# Altium footprint library Cty1.PcbLib: 1378 footprints (part 73 of 87)
Each footprint in its own frame and in the unit in brackets; x right, y up, seen from the top. Pads: shape width x height; smd on the part's side, far side on the other; paste and mask are expansions set on the pad; w line width, h text height; cw(c..) or ccw(c..) is an arc to the next point about the centre after c.
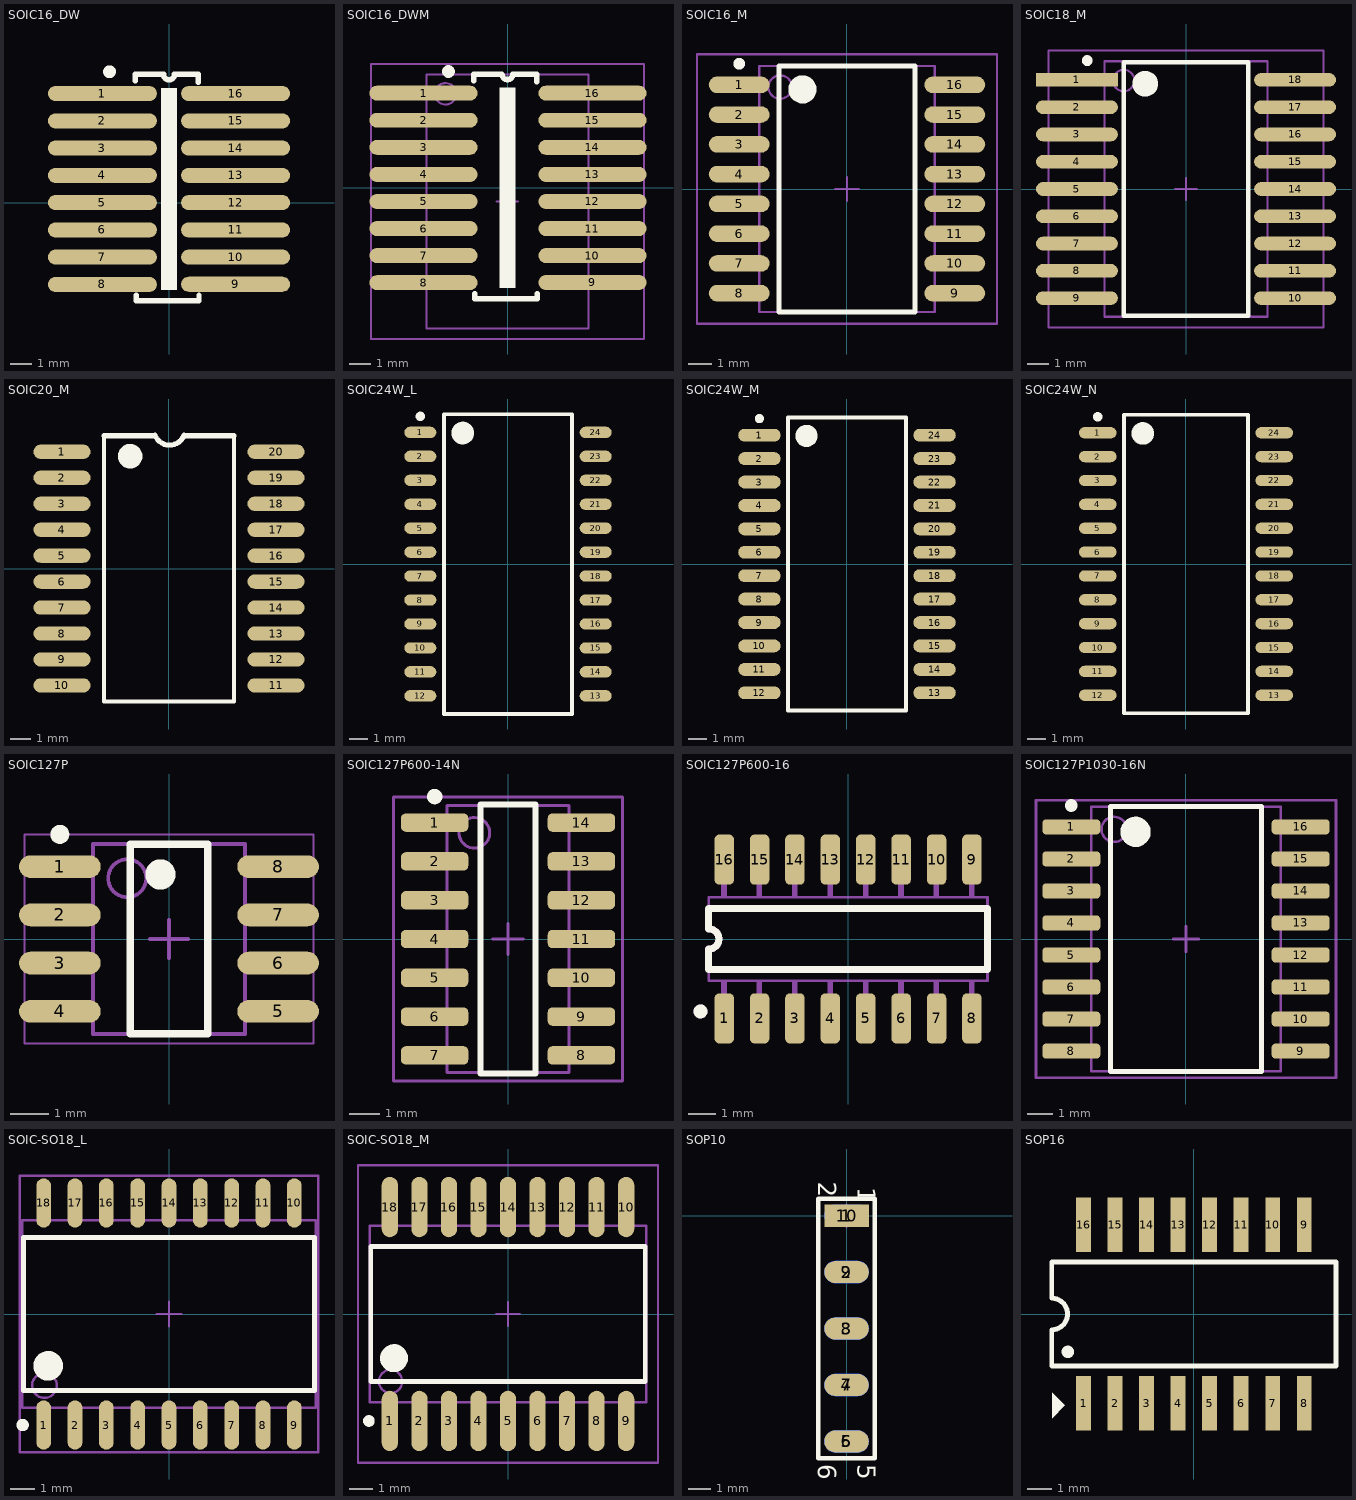
[diagram p72: the footprints below, top view; thin cyan lines are the x and y axes]

## SOIC16_DW [mm] "SOIC, 16-Leads, Body 10x3.8mm, Pitch 1.27mm"
height 2.65
pads (16):
  oval 5.08x0.7 smd: 1(-3.1,5.08) 2(-3.1,3.81) 3(-3.1,2.54) 4(-3.1,1.27) 5(-3.1,0) 6(-3.1,-1.27) 7(-3.1,-2.54) 8(-3.1,-3.81) 9(3.1,-3.8) 10(3.1,-2.54) 11(3.1,-1.27) 12(3.1,0) 13(3.1,1.27) 14(3.1,2.54) 15(3.1,3.81) 16(3.1,5.08)
Top Overlay:
  circle w0.4: c-2.767,6.096 r0.1
  rectangle: -0.381,-4.064 0.381,5.334
  lines w0.254: -1.575,5.664 -1.575,5.969 -0.254,5.969 ccw(c0,5.969) 0.254,5.969 1.372,5.969 1.372,5.613 ; -1.524,-4.318 -1.524,-4.572 1.397,-4.572 1.397,-4.318

## SOIC16_DWM [mm] "SOIC, 16-Leads, Body 10x3.8mm, Pitch 0.3inc"
height 2.65
pads (16):
  oval 5.08x0.7 smd: 1(-3.963,4.445) 2(-3.963,3.175) 3(-3.963,1.905) 4(-3.963,0.635) 5(-3.963,-0.635) 6(-3.963,-1.905) 7(-3.963,-3.175) 8(-3.963,-4.445) 9(3.963,-4.435) 10(3.963,-3.175) 11(3.963,-1.905) 12(3.963,-0.635) 13(3.963,0.635) 14(3.963,1.905) 15(3.963,3.175) 16(3.963,4.445)
Top Overlay:
  circle w0.4: c-2.793,5.461 r0.1
  rectangle: -0.407,-4.699 0.355,4.699
  lines w0.254: -1.601,5.029 -1.601,5.334 -0.28,5.334 ccw(c-0.026,5.334) 0.228,5.334 1.346,5.334 1.346,4.978 ; -1.55,-4.953 -1.55,-5.207 1.371,-5.207 1.371,-4.953
Mechanical 13:
  circle w0.1: c-2.926,4.415 r0.5
  lines w0.1: -3.826,-6.585 -3.826,5.315 3.774,5.315 3.774,-6.585 -3.826,-6.585
Mechanical 15:
  lines w0.1: -0.526,-0.635 0.474,-0.635 ; -0.026,-1.135 -0.026,-0.135 ; -6.426,-7.085 -6.426,5.815 6.374,5.815 6.374,-7.085 -6.426,-7.085
3D body: height 2.65, standoff 0, extent -3.826,-6.585 3.774,5.315

## SOIC16_M [mm] "16-Pin Small Outline Integrated Circuit Package (SOIC16), IPC Low Density"
height 2.65
pads (16):
  oval 2.6x0.7 smd: 1(-4.6,4.445) 2(-4.6,3.175) 3(-4.6,1.905) 4(-4.6,0.635) 5(-4.6,-0.635) 6(-4.6,-1.905) 7(-4.6,-3.175) 8(-4.6,-4.445) 9(4.6,-4.445) 10(4.6,-3.175) 11(4.6,-1.905) 12(4.6,-0.635) 13(4.6,0.635) 14(4.6,1.905) 15(4.6,3.175) 16(4.6,4.445)
Top Overlay:
  circle w0.6: c-1.9,4.25 r0.3
  circle w0.25: c-4.6,5.345 r0.125
  lines w0.2: -2.9,-5.25 2.9,-5.25 2.9,5.25 -2.9,5.25 -2.9,-5.25
Mechanical 13:
  circle w0.1: c-2.85,4.35 r0.5
  lines w0.1: -3.75,-5.25 3.75,-5.25 3.75,5.25 -3.75,5.25 -3.75,-5.25
Mechanical 15:
  lines w0.1: -0.5,0 0.5,0 ; 0,-0.5 0,0.5 ; -6.4,-5.75 6.4,-5.75 6.4,5.75 -6.4,5.75 -6.4,-5.75
3D body: height 2.65, standoff 0, extent -3.75,-5.25 3.75,5.25

## SOIC18_M [mm] "SOIC, 18-Leads, Body 11.6x7.5mm, Pitch 1.27mm, IPC Low Density"
height 2.65
pads (18):
  rect 3.81x0.635 smd: 1(-5.08,5.08)
  oval 3.81x0.635 smd: 2(-5.08,3.81) 3(-5.08,2.54) 4(-5.08,1.27) 5(-5.08,0) 6(-5.08,-1.27) 7(-5.08,-2.54) 8(-5.08,-3.81) 9(-5.08,-5.08) 10(5.08,-5.08) 11(5.08,-3.81) 12(5.08,-2.54) 13(5.08,-1.27) 14(5.08,0) 15(5.08,1.27) 16(5.08,2.54) 17(5.08,3.81) 18(5.08,5.08)
Top Overlay:
  circle w0.25: c-4.6,5.98 r0.125
  circle w0.6: c-1.9,4.9 r0.3
  lines w0.2: -2.9,-5.9 -2.9,5.9 2.9,5.9 2.9,-5.9 -2.9,-5.9
Mechanical 13:
  circle w0.1: c-2.9,5.05 r0.5
  lines w0.1: -3.8,-5.95 -3.8,5.95 3.8,5.95 3.8,-5.95 -3.8,-5.95
Mechanical 15:
  lines w0.1: -0.5,0 0.5,0 ; 0,-0.5 0,0.5 ; -6.4,-6.45 -6.4,6.45 6.4,6.45 6.4,-6.45 -6.4,-6.45

## SOIC20_M [mm] "20-Pin Small Outline Integrated Circuit 1.27 mm Pitch, IPC Low Density"
height 2.65
pads (20):
  oval 2.794x0.7 smd: 1(-5.235,5.715) 2(-5.235,4.445) 3(-5.235,3.175) 4(-5.235,1.905) 5(-5.235,0.635) 6(-5.235,-0.635) 7(-5.235,-1.905) 8(-5.235,-3.175) 9(-5.235,-4.445) 10(-5.235,-5.715) 11(5.235,-5.715) 12(5.235,-4.445) 13(5.235,-3.175) 14(5.235,-1.905) 15(5.235,-0.635) 16(5.235,0.635) 17(5.235,1.905) 18(5.235,3.175) 19(5.235,4.445) 20(5.235,5.715)
Top Overlay:
  circle w0.6: c-1.9,5.5 r0.3
  lines w0.2: -3.175,6.5 -3.175,-6.5 3.175,-6.5 3.175,6.5
  lines w0.254: -3.175,6.5 -0.785,6.5 ; -0.692,6.535 ccw(c0.022,6.802) 0.73,6.522 ; 0.785,6.5 3.175,6.5

## SOIC24W_L [mm] "SOIC, 24-Leads, Body 15.4x7.5mm, Pitch 1.27mm, IPC High Density"
height 2.67
pads (24):
  oval 1.7x0.6 smd: 1(-4.65,6.985) 2(-4.65,5.715) 3(-4.65,4.445) 4(-4.65,3.175) 5(-4.65,1.905) 6(-4.65,0.635) 7(-4.65,-0.635) 8(-4.65,-1.905) 9(-4.65,-3.175) 10(-4.65,-4.445) 11(-4.65,-5.715) 12(-4.65,-6.985) 13(4.65,-6.985) 14(4.65,-5.715) 15(4.65,-4.445) 16(4.65,-3.175) 17(4.65,-1.905) 18(4.65,-0.635) 19(4.65,0.635) 20(4.65,1.905) 21(4.65,3.175) 22(4.65,4.445) 23(4.65,5.715) 24(4.65,6.985)
Top Overlay:
  circle w0.25: c-4.65,7.835 r0.125
  circle w0.6: c-2.4,6.95 r0.3
  lines w0.2: -3.4,-7.95 -3.4,7.95 3.4,7.95 3.4,-7.95 -3.4,-7.95

## SOIC24W_M [mm] "SOIC, 24-Leads, Body 15.4x7.5mm, Pitch 1.27mm, IPC Low Density"
height 2.67
pads (24):
  oval 2.3x0.7 smd: 1(-4.75,6.985) 2(-4.75,5.715) 3(-4.75,4.445) 4(-4.75,3.175) 5(-4.75,1.905) 6(-4.75,0.635) 7(-4.75,-0.635) 8(-4.75,-1.905) 9(-4.75,-3.175) 10(-4.75,-4.445) 11(-4.75,-5.715) 12(-4.75,-6.985) 13(4.75,-6.985) 14(4.75,-5.715) 15(4.75,-4.445) 16(4.75,-3.175) 17(4.75,-1.905) 18(4.75,-0.635) 19(4.75,0.635) 20(4.75,1.905) 21(4.75,3.175) 22(4.75,4.445) 23(4.75,5.715) 24(4.75,6.985)
Top Overlay:
  circle w0.6: c-2.2,6.95 r0.3
  circle w0.25: c-4.75,7.885 r0.125
  lines w0.2: -3.2,-7.95 3.2,-7.95 3.2,7.95 -3.2,7.95 -3.2,-7.95

## SOIC24W_N [mm] "SOIC, 24-Leads, Body 15.4x7.5mm, Pitch 1.27mm, IPC Medium Density"
height 2.67
pads (24):
  oval 2x0.6 smd: 1(-4.7,6.985) 2(-4.7,5.715) 3(-4.7,4.445) 4(-4.7,3.175) 5(-4.7,1.905) 6(-4.7,0.635) 7(-4.7,-0.635) 8(-4.7,-1.905) 9(-4.7,-3.175) 10(-4.7,-4.445) 11(-4.7,-5.715) 12(-4.7,-6.985) 13(4.7,-6.985) 14(4.7,-5.715) 15(4.7,-4.445) 16(4.7,-3.175) 17(4.7,-1.905) 18(4.7,-0.635) 19(4.7,0.635) 20(4.7,1.905) 21(4.7,3.175) 22(4.7,4.445) 23(4.7,5.715) 24(4.7,6.985)
Top Overlay:
  circle w0.25: c-4.7,7.835 r0.125
  circle w0.6: c-2.3,6.95 r0.3
  lines w0.2: -3.3,-7.95 -3.3,7.95 3.3,7.95 3.3,-7.95 -3.3,-7.95

## SOIC127P [mm] "SOIC, 8-Leads, Body 5.00x4.00mm, Pitch 1.27mm, IPC Medium Density"
height 1.7
pads (8):
  oval 2.15x0.6 smd: 1(-2.875,1.905) 2(-2.875,0.635) 3(-2.875,-0.635) 4(-2.875,-1.905) 5(2.875,-1.905) 6(2.875,-0.635) 7(2.875,0.635) 8(2.875,1.905)
Top Overlay:
  circle w0.4: c-0.225,1.7 r0.2
  circle w0.25: c-2.875,2.755 r0.125
  lines w0.2: -1.025,-2.5 1.025,-2.5 1.025,2.5 -1.025,2.5 -1.025,-2.5
Mechanical 13:
  circle w0.1: c-1.1,1.6 r0.5
  lines w0.1: -2,-2.5 2,-2.5 2,2.5 -2,2.5 -2,-2.5
Mechanical 15:
  lines w0.05: -3.8,-2.75 3.8,-2.75 3.8,2.75 -3.8,2.75 -3.8,-2.75
  lines w0.1: -0.5,0 0.5,0 ; 0,-0.5 0,0.5
3D body: height 1.7, standoff 1.7, extent -2,-2.5 2,2.5

## SOIC127P600-14N [mm]
pads (14):
  rrect50% 2.2x0.6 smd: 1(-2.4,3.81) 2(-2.4,2.54) 3(-2.4,1.27) 4(-2.4,0) 5(-2.4,-1.27) 6(-2.4,-2.54) 7(-2.4,-3.81) 8(2.4,-3.81) 9(2.4,-2.54) 10(2.4,-1.27) 11(2.4,0) 12(2.4,1.27) 13(2.4,2.54) 14(2.4,3.81)
Top Overlay:
  circle w0.25: c-2.4,4.66 r0.125
  lines w0.2: -0.9,-4.4 -0.9,4.4 0.9,4.4 0.9,-4.4 -0.9,-4.4
Mechanical 13:
  circle w0.1: c-1.1,3.475 r0.5
  lines w0.1: -2,-4.375 -2,4.375 2,4.375 2,-4.375 -2,-4.375
Mechanical 15:
  lines w0.1: -0.5,0 0.5,0 ; 0,-0.5 0,0.5 ; -3.75,-4.65 -3.75,4.65 3.75,4.65 3.75,-4.65 -3.75,-4.65
3D body "SW3dPS-SOIC14-150.STEP": height 1.75, standoff 0, extent -2.879,-4.275 2.921,4.275

## SOIC127P600-16 [mm]
pads (16):
  rrect50% 0.7x1.8 smd: 1(-4.445,-2.85) 2(-3.175,-2.85) 3(-1.905,-2.85) 4(-0.635,-2.85) 5(0.635,-2.85) 6(1.905,-2.85) 7(3.175,-2.85) 8(4.445,-2.85) 9(4.445,2.85) 10(3.175,2.85) 11(1.905,2.85) 12(0.635,2.85) 13(-0.635,2.85) 14(-1.905,2.85) 15(-3.175,2.85) 16(-4.445,2.85)
Top Overlay:
  circle w0.25: c-5.295,-2.6 r0.125
  lines w0.254: -5,-1.1 5,-1.1 5,1.1 -5,1.1 -5,0.367 cw(c-5,0) -5,-0.367 -5,-1.1
Mechanical 7:
  circle w0.25: c-5.295,-2.6 r0.125
  region: 4.34,-1.5 4.34,-2.8 4.54,-2.8 4.54,-1.5
  region: 3.07,-1.5 3.07,-2.8 3.27,-2.8 3.27,-1.5
  region: 1.8,-1.5 1.8,-2.8 2,-2.8 2,-1.5
  region: 0.53,-1.5 0.53,-2.8 0.73,-2.8 0.73,-1.5
  region: -0.74,-1.5 -0.74,-2.8 -0.54,-2.8 -0.54,-1.5
  region: -2.01,-1.5 -2.01,-2.8 -1.81,-2.8 -1.81,-1.5
  region: -3.28,-1.5 -3.28,-2.8 -3.08,-2.8 -3.08,-1.5
  region: -4.55,-1.5 -4.55,-2.8 -4.35,-2.8 -4.35,-1.5
  region: 4.54,1.5 4.54,2.8 4.34,2.8 4.34,1.5
  region: 3.27,1.5 3.27,2.8 3.07,2.8 3.07,1.5
  region: 2,1.5 2,2.8 1.8,2.8 1.8,1.5
  region: 0.73,1.5 0.73,2.8 0.53,2.8 0.53,1.5
  region: -0.54,1.5 -0.54,2.8 -0.74,2.8 -0.74,1.5
  region: -1.81,1.5 -1.81,2.8 -2.01,2.8 -2.01,1.5
  region: -3.08,1.5 -3.08,2.8 -3.28,2.8 -3.28,1.5
  region: -4.35,1.5 -4.35,2.8 -4.55,2.8 -4.55,1.5
  lines w0.1: -5,-0.367 -5,-1.5 5,-1.5 5,1.5 -5,1.5 -5,0.367
  lines w0.254: -5,-0.367 ccw(c-5,0) -5,0.367
  text ".Comment" at -4.8,-1.3 h0.8
  text ".Designator" at -4.8,0.8 h0.8
3D body "SW3dPS-SOIC16-150.STEP": height 1.75, standoff 0, extent -4.9,-2.875 4.9,2.925

## SOIC127P1030-16N [mm]
pads (16):
  rrect50% 2.3x0.6 smd: 1(-4.55,4.445) 2(-4.55,3.175) 3(-4.55,1.905) 4(-4.55,0.635) 5(-4.55,-0.635) 6(-4.55,-1.905) 7(-4.55,-3.175) 8(-4.55,-4.445) 9(4.55,-4.445) 10(4.55,-3.175) 11(4.55,-1.905) 12(4.55,-0.635) 13(4.55,0.635) 14(4.55,1.905) 15(4.55,3.175) 16(4.55,4.445)
Top Overlay:
  circle w0.6: c-2,4.25 r0.3
  circle w0.25: c-4.55,5.295 r0.125
  lines w0.2: -3,-5.25 3,-5.25 3,5.25 -3,5.25 -3,-5.25
Mechanical 13:
  circle w0.1: c-2.85,4.35 r0.5
  lines w0.1: -3.75,-5.25 3.75,-5.25 3.75,5.25 -3.75,5.25 -3.75,-5.25
Mechanical 15:
  lines w0.1: -0.5,0 0.5,0 ; 0,-0.5 0,0.5 ; -5.95,-5.5 5.95,-5.5 5.95,5.5 -5.95,5.5 -5.95,-5.5
3D body: height 0.2, standoff 0, extent 2.978,-0.905 4.851,-0.296
3D body: height 0.2, standoff 0, extent 2.959,-2.182 4.851,-1.573
3D body: height 0.2, standoff 0, extent 2.998,-3.477 4.851,-2.868
3D body: height 0.2, standoff 0, extent 3.025,-4.734 4.895,-4.164
3D body: height 0.2, standoff 0, extent 2.934,4.172 4.807,4.781
3D body: height 0.2, standoff 0, extent 2.915,2.895 4.807,3.504
3D body: height 0.2, standoff 0, extent 2.954,1.6 4.807,2.209
3D body: height 0.2, standoff 0, extent 2.981,0.343 4.851,0.913
3D body: height 0.2, standoff 0, extent -4.859,0.305 -2.987,0.914
3D body: height 0.2, standoff 0, extent -4.859,1.582 -2.968,2.191
3D body: height 0.2, standoff 0, extent -4.859,2.877 -3.007,3.486
3D body: height 0.2, standoff 0, extent -4.903,4.173 -3.034,4.743
3D body: height 0.2, standoff 0, extent -4.851,-0.917 -2.982,-0.347
3D body: height 0.2, standoff 0, extent -4.807,-2.213 -2.955,-1.604
3D body: height 0.2, standoff 0, extent -4.807,-3.508 -2.916,-2.899
3D body: height 0.2, standoff 0, extent -4.807,-4.785 -2.935,-4.176
3D body: height 2.65, standoff 0, extent -3.75,-5.25 3.75,5.25

## SOIC-SO18_L [mm] "SOIC, 18-Leads, Body 11.5x7.5mm, Pitch 1.27mm, IPC High Density"
height 2.65
pads (18):
  oval 0.6x2 smd: 1(-5.08,-4.5) 2(-3.81,-4.5) 3(-2.54,-4.5) 4(-1.27,-4.5) 5(0,-4.5) 6(1.27,-4.5) 7(2.54,-4.5) 8(3.81,-4.5) 9(5.08,-4.5) 10(5.08,4.5) 11(3.81,4.5) 12(2.54,4.5) 13(1.27,4.5) 14(0,4.5) 15(-1.27,4.5) 16(-2.54,4.5) 17(-3.81,4.5) 18(-5.08,4.5)
Top Overlay:
  circle w0.25: c-5.93,-4.5 r0.125
  circle w0.6: c-4.9,-2.1 r0.3
  lines w0.2: -5.9,-3.1 5.9,-3.1 5.9,3.1 -5.9,3.1 -5.9,-3.1
Mechanical 13:
  circle w0.1: c-5.05,-2.9 r0.5
  lines w0.1: -5.95,-3.8 5.95,-3.8 5.95,3.8 -5.95,3.8 -5.95,-3.8
Mechanical 15:
  lines w0.1: -0.5,0 0.5,0 ; 0,-0.5 0,0.5 ; -6.05,-5.6 6.05,-5.6 6.05,5.6 -6.05,5.6 -6.05,-5.6
3D body "PIC16F819-I-SOIC18.step": height 2.52, standoff 0.01, extent -5.765,-5.133 5.765,5.207

## SOIC-SO18_M [mm] "SOIC, 18-Leads, Body 11.5x7.5mm, Pitch 1.27mm, IPC Low Density"
height 2.65
pads (18):
  oval 0.7x2.6 smd: 1(-5.08,-4.6) 2(-3.81,-4.6) 3(-2.54,-4.6) 4(-1.27,-4.6) 5(0,-4.6) 6(1.27,-4.6) 7(2.54,-4.6) 8(3.81,-4.6) 9(5.08,-4.6) 10(5.08,4.6) 11(3.81,4.6) 12(2.54,4.6) 13(1.27,4.6) 14(0,4.6) 15(-1.27,4.6) 16(-2.54,4.6) 17(-3.81,4.6) 18(-5.08,4.6)
Top Overlay:
  circle w0.25: c-5.98,-4.6 r0.125
  circle w0.6: c-4.9,-1.9 r0.3
  lines w0.2: -5.9,-2.9 5.9,-2.9 5.9,2.9 -5.9,2.9 -5.9,-2.9
Mechanical 13:
  circle w0.1: c-5.05,-2.9 r0.5
  lines w0.1: -5.95,-3.8 5.95,-3.8 5.95,3.8 -5.95,3.8 -5.95,-3.8
Mechanical 15:
  lines w0.1: -0.5,0 0.5,0 ; 0,-0.5 0,0.5 ; -6.45,-6.4 6.45,-6.4 6.45,6.4 -6.45,6.4 -6.45,-6.4
3D body "PIC16F819-I-SOIC18.step": height 2.52, standoff 0.01, extent -5.765,-5.133 5.765,5.207

## SOP10 [mm] "SOIC 10 hai lop"
height 2.54
pads (10):
  rect 2x1 smd: 1(0,0)
  oval 2x1 smd: 2(0,-2.54) 3(0,-5.08) 4(0,-7.62) 5(0,-10.16)
  oval 2x1 smd far side: 6(0,-10.16) 7(0,-7.62) 8(0,-5.08) 9(0,-2.54) 10(0,0)
Top Overlay:
  lines w0.2: -1.27,0 -1.27,0.762 1.27,0.762 1.27,0 ; -1.27,0.086 -1.27,-10.414 -1.27,-10.922 1.27,-10.922 1.27,-10.414 1.27,0.086
  text "6" at -1.27,-11.176 h0.8
  text "5" at 0.508,-11.176 h0.8
  text "2" at -1.27,1.524 h0.8
  text "1" at 0.508,1.27 h0.8
Mechanical 15:
  lines w0.1: -0.5,0 0.5,0 ; 0,-0.5 0,0.5

## SOP16 [mm] "Small Outline; 16 Leads; Body Width 5.6 mm; Pitch 1.27 mm"
height 2
pads (16):
  rect 0.6x2.2 smd: 1(-4.445,-3.6) 2(-3.175,-3.6) 3(-1.905,-3.6) 4(-0.635,-3.6) 5(0.635,-3.6) 6(1.905,-3.6) 7(3.175,-3.6) 8(4.445,-3.6) 9(4.445,3.6) 10(3.175,3.6) 11(1.905,3.6) 12(0.635,3.6) 13(-0.635,3.6) 14(-1.905,3.6) 15(-3.175,3.6) 16(-4.445,3.6)
Top Overlay:
  circle w0.25: c-5.078,-1.524 r0.125
  region: -5.715,-4.191 -5.207,-3.683 -5.715,-3.175
  lines w0.2: -5.725,-2.1 -5.725,-0.635 ccw(c-5.725,0) -5.725,0.635 -5.725,2.1 5.725,2.1 5.725,-2.1 -5.725,-2.1